# Altium footprint library AMLB_v1.PcbLib: 147 footprints (part 5 of 10)
Each footprint in its own frame and in the unit in brackets; x right, y up, seen from the top. Pads: shape width x height; smd on the part's side, far side on the other; paste and mask are expansions set on the pad; w line width, h text height; cw(c..) or ccw(c..) is an arc to the next point about the centre after c.
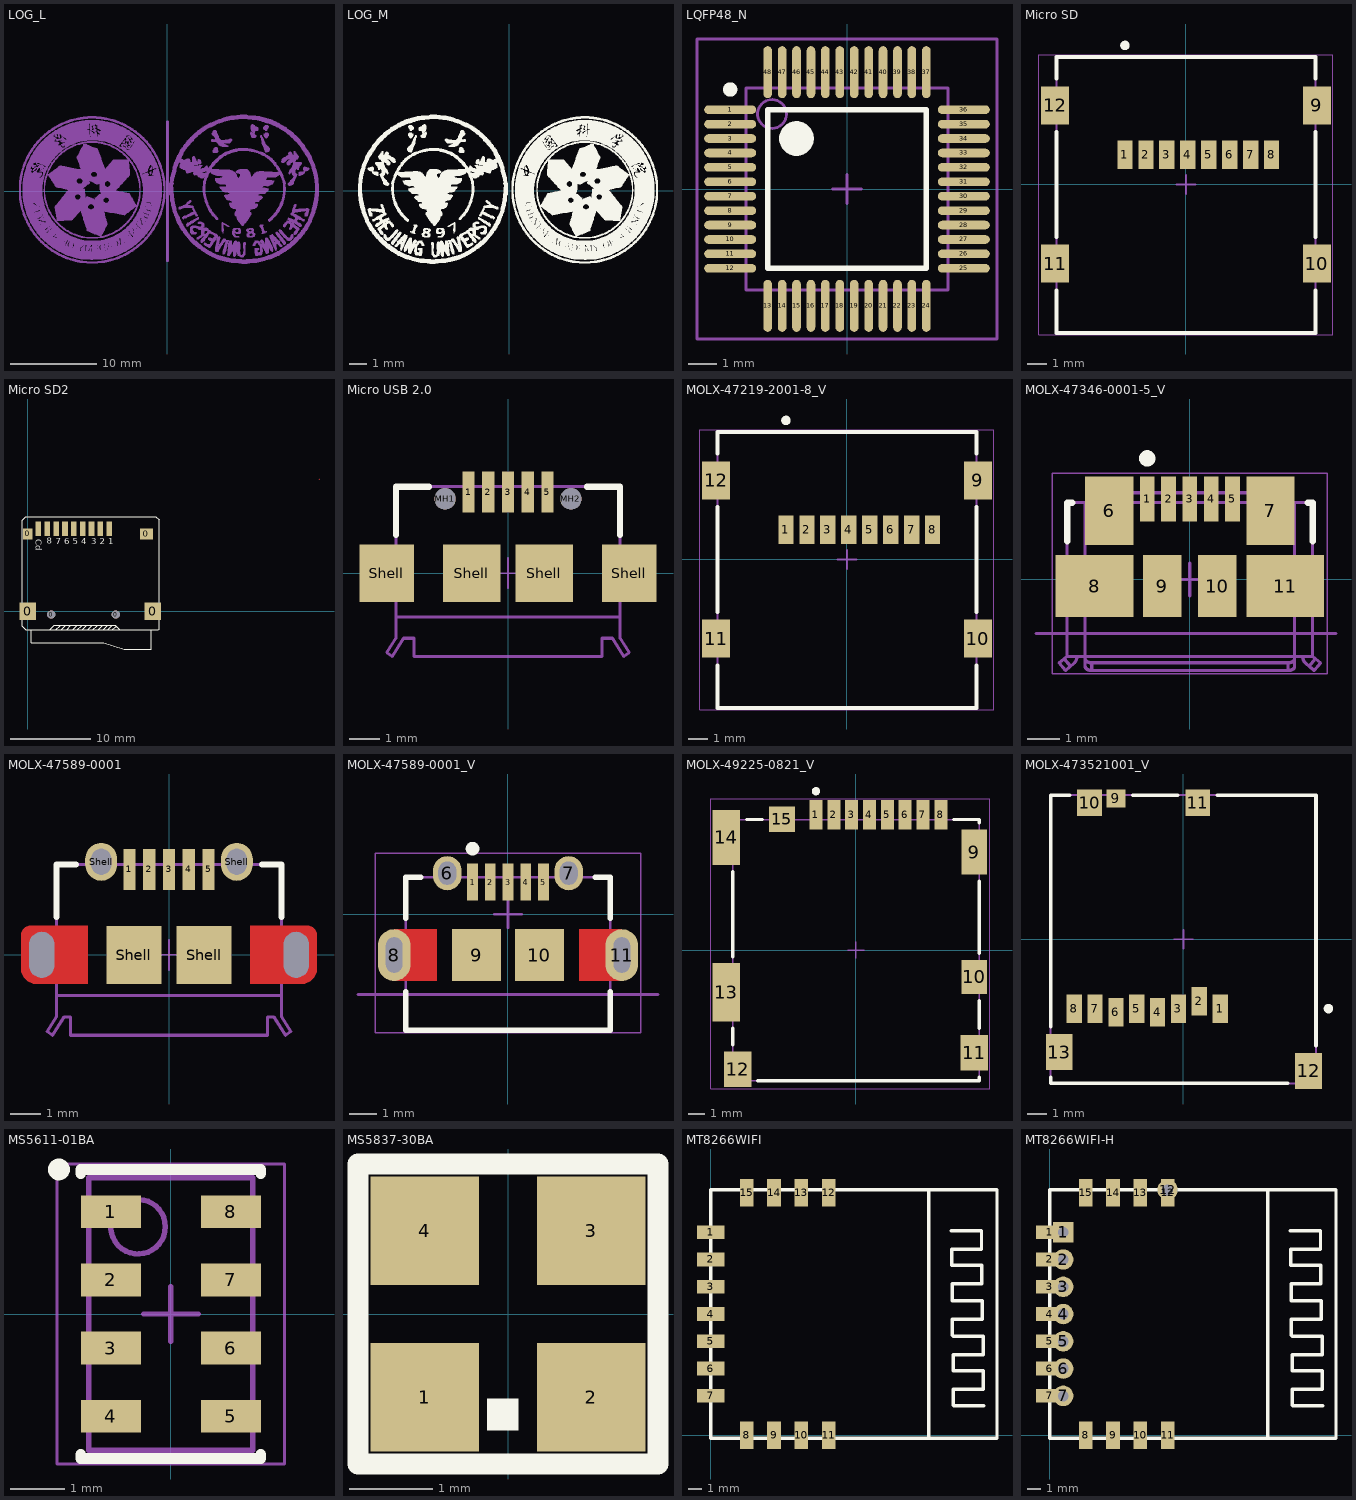
[diagram p4: the footprints below, top view; thin cyan lines are the x and y axes]

## LOG_L [mm]
Bottom Overlay:
  drawing of 5493 lines, arcs and shapes, not listed

## LOG_M [mm]
Top Overlay:
  drawing of 5491 lines, arcs and shapes, not listed

## LQFP48_N [mm]
height 0.559
pads (48):
  oval 1.8x0.3 smd: 1(-4.05,2.75) 2(-4.05,2.25) 3(-4.05,1.75) 4(-4.05,1.25) 5(-4.05,0.75) 6(-4.05,0.25) 7(-4.05,-0.25) 8(-4.05,-0.75) 9(-4.05,-1.25) 10(-4.05,-1.75) 11(-4.05,-2.25) 12(-4.05,-2.75) 25(4.05,-2.75) 26(4.05,-2.25) 27(4.05,-1.75) 28(4.05,-1.25) 29(4.05,-0.75) 30(4.05,-0.25) 31(4.05,0.25) 32(4.05,0.75) 33(4.05,1.25) 34(4.05,1.75) 35(4.05,2.25) 36(4.05,2.75)
  oval 0.3x1.8 smd: 13(-2.75,-4.05) 14(-2.25,-4.05) 15(-1.75,-4.05) 16(-1.25,-4.05) 17(-0.75,-4.05) 18(-0.25,-4.05) 19(0.25,-4.05) 20(0.75,-4.05) 21(1.25,-4.05) 22(1.75,-4.05) 23(2.25,-4.05) 24(2.75,-4.05) 37(2.75,4.05) 38(2.25,4.05) 39(1.75,4.05) 40(1.25,4.05) 41(0.75,4.05) 42(0.25,4.05) 43(-0.25,4.05) 44(-0.75,4.05) 45(-1.25,4.05) 46(-1.75,4.05) 47(-2.25,4.05) 48(-2.75,4.05)
Top Overlay:
  circle w0.6: c-1.75,1.75 r0.3
  circle w0.25: c-4.05,3.45 r0.125
  lines w0.2: -2.75,-2.75 2.75,-2.75 2.75,2.75 -2.75,2.75 -2.75,-2.75
Mechanical 13:
  circle w0.1: c-2.6,2.6 r0.5
  lines w0.1: -3.5,-3.5 3.5,-3.5 3.5,3.5 -3.5,3.5 -3.5,-3.5
Mechanical 15:
  lines w0.1: -0.5,0 0.5,0 ; 0,-0.5 0,0.5 ; -5.2,-5.2 5.2,-5.2 5.2,5.2 -5.2,5.2 -5.2,-5.2

## Micro SD [mm] "CONN, 8-Leads, Body 14.5x13.6mm, Pitch 1.1mm"
height 1.9
pads (12):
  rect 0.8x1.5 smd: 1(-3.205,1.55) 2(-2.105,1.55) 3(-1.005,1.55) 4(0.095,1.55) 5(1.195,1.55) 6(2.295,1.55) 7(3.395,1.55) 8(4.495,1.55)
  rect 1.45x2 smd: 9(6.875,4.15) 10(6.875,-4.15) 11(-6.875,-4.15) 12(-6.875,4.15)
Top Overlay:
  circle w0.25: c-3.205,7.3 r0.125
  lines w0.2: -6.8,-5.55 -6.8,-7.8 6.8,-7.8 6.8,-5.55 ; -6.8,-2.75 -6.8,2.75 ; -6.8,5.55 -6.8,6.7 6.8,6.7 6.8,5.55 ; 6.8,-2.75 6.8,2.75
Mechanical 13:
  lines w0.1: -6.8,-7.8 -6.8,6.7 6.8,6.7 6.8,-7.8 -6.8,-7.8
Mechanical 15:
  lines w0.05: -7.725,-7.9 -7.725,6.8 7.7,6.8 7.7,-7.9 -7.725,-7.9
  lines w0.1: -0.5,0 0.5,0 ; 0,-0.5 0,0.5
3D body "472192001.stp": height 1.91, standoff 0.02, extent -7.3,-7.793 7.3,6.707

## Micro SD2 [mm]
pads (15):
  rect 2.032x2.2 smd: 0(0,0) 0(15.5,0)
  rect 1.2x1.4 smd: 0(0,9.6)
  round 1 hole 1 unplated: 0(2.9,-0.4) 0(10.9,-0.4)
  rect 1.6x1.4 smd: 0(14.7,9.6)
  rect 0.7x1.8 smd: 1(10.1,10.227) 2(9,10.227) 3(7.9,10.227) 4(6.8,10.227) 5(5.7,10.227) 6(4.6,10.227) 7(3.5,10.227) 8(2.4,10.227) 9(1.3,10.227)
Top Layer:
  lines w0.03: 36.064,16.423 36.114,16.373
Top Overlay:
  lines w0.152: 0.423,-2.295 0.423,-3.87 9.414,-3.87 ; 3.471,-2.295 4.004,-1.762 4.004,-1.736 ; 4.131,-2.295 4.639,-1.787 4.639,-1.736 ; 4.868,-2.295 4.868,-2.219 5.35,-1.736 ; 5.553,-2.295 6.112,-1.736 6.138,-1.736 ; 6.138,-2.295 6.671,-1.762 6.671,-1.736 ; 6.773,-2.295 7.331,-1.736 7.433,-1.736 ; 7.433,-2.295 7.992,-1.736 8.017,-1.736 ; 8.068,-2.295 8.601,-1.762 8.601,-1.736 ; 8.703,-2.295 9.262,-1.736 9.389,-1.736 ; 9.338,-2.295 9.897,-1.736 9.922,-1.736 ; 9.389,-3.87 11.954,-4.683 15.307,-4.683 15.307,-2.321 ; 9.922,-2.295 10.481,-1.736 ; 10.481,-2.295 10.887,-1.889 10.964,-1.889 ; -0.289,-2.295 -0.72,-1.863 -0.72,11.319 -0.289,11.751 15.891,11.751 16.272,11.37 16.272,-2.194 16.171,-2.295 ; -0.289,-2.295 16.171,-2.295 ; -0.289,-2.295 2.709,-2.295 3.267,-1.736 10.811,-1.736 11.37,-2.295 16.171,-2.295
  text "Cd" at 0.981,8.932 h0.76
  text "8" at 2.328,8.373 h0.76
  text "7" at 3.445,8.347 h0.76
  text "6" at 4.512,8.347 h0.76
  text "5" at 5.579,8.347 h0.76
  text "4" at 6.646,8.322 h0.76
  text "3" at 7.839,8.322 h0.76
  text "2" at 8.906,8.322 h0.76
  text "1" at 9.998,8.297 h0.76
3D body "sdcard.STEP": height 1.8, standoff -0.7, extent -0.272,-4.625 16.001,10.569

## Micro USB 2.0 [mm] "629105136821,Micro USB 2.0 SMT Type B Horizontal 5 Contacts"
height 3
pads (11):
  rect 0.4x1.35 smd: 1(-1.3,2.675) 2(-0.65,2.675) 3(0,2.675) 4(0.65,2.675) 5(1.3,2.675)
  round 0.7 hole 0.7 unplated: MH1(-2.075,2.45) MH2(2.075,2.45)
  rect 1.8x1.9 smd: Shell(-4,0) Shell(4,0)
  rect 1.9x1.9 smd: Shell(-1.2,0) Shell(1.2,0)
Top Overlay:
  lines w0.2: -3.7,1.25 -3.7,2.85 -2.6,2.85 ; 2.6,2.85 3.7,2.85 3.7,1.25
Mechanical 2:
  lines w0.1: -3.7,-1.45 3.7,-1.45
  text "PCB Edge" at -1.2,-2.1 h0.41
Mechanical 13:
  lines w0.1: -1.425,2.85 -1.425,3.15 -1.175,3.15 -1.175,2.85 ; -0.775,2.85 -0.775,3.15 -0.525,3.15 -0.525,2.85 ; -0.125,2.85 -0.125,3.15 0.125,3.15 0.125,2.85 ; 0.525,2.85 0.525,3.15 0.775,3.15 0.775,2.85 ; 1.175,2.85 1.175,3.15 1.425,3.15 1.425,2.85 ; -4,-2.625 -3.7,-2.15 -3.7,2.85 3.7,2.85 3.7,-2.15 4,-2.625 3.825,-2.75 3.45,-2.15 3.1,-2.15 3.1,-2.75 -3.1,-2.75 -3.1,-2.15 -3.45,-2.15 -3.825,-2.75 -4,-2.625
Mechanical 15:
  lines w0.05: -0.5,0 0.5,0 ; 0,-0.5 0,0.5
3D body "629105136821.stp": height 2.69, standoff -0.61, extent -4,-2.73 4,3.173

## MOLX-47219-2001-8_V [mm] "CONN, 8-Leads, Body 14.5x13.6mm, Pitch 1.1mm"
height 1.9
pads (12):
  rect 0.8x1.5 smd: 1(-3.205,1.55) 2(-2.105,1.55) 3(-1.005,1.55) 4(0.095,1.55) 5(1.195,1.55) 6(2.295,1.55) 7(3.395,1.55) 8(4.495,1.55)
  rect 1.45x2 smd: 9(6.875,4.15) 10(6.875,-4.15) 11(-6.875,-4.15) 12(-6.875,4.15)
Top Overlay:
  circle w0.25: c-3.205,7.3 r0.125
  lines w0.2: -6.8,-5.55 -6.8,-7.8 6.8,-7.8 6.8,-5.55 ; -6.8,-2.75 -6.8,2.75 ; -6.8,5.55 -6.8,6.7 6.8,6.7 6.8,5.55 ; 6.8,-2.75 6.8,2.75
Mechanical 13:
  lines w0.1: -6.8,-7.8 6.8,-7.8 6.8,6.7 -6.8,6.7 -6.8,-7.8
Mechanical 15:
  lines w0.05: -7.725,-7.9 7.7,-7.9 7.7,6.8 -7.725,6.8 -7.725,-7.9
  lines w0.1: -0.5,0 0.5,0 ; 0,-0.5 0,0.5
3D body "472192001.stp": height 1.91, standoff 0.02, extent -7.3,-7.793 7.3,6.707

## MOLX-47346-0001-5_V [mm] "SMD, 5-Leads, Body 7.5x5mm, Pitch 0.65mm"
height 2.94
pads (11):
  rect 0.45x1.38 smd: 1(-1.3,2.46) 2(-0.65,2.46) 3(0,2.46) 4(0.65,2.46) 5(1.3,2.46)
  rect 1.475x2.1 smd: 6(-2.462,2.1) 7(2.462,2.1)
  rect 2.375x1.9 smd: 8(-2.913,-0.2) 11(2.913,-0.2)
  rect 1.175x1.9 smd: 9(-0.837,-0.2) 10(0.837,-0.2)
Top Overlay:
  circle w0.25: c-1.3,3.7 r0.125
  lines w0.2: -3.75,1.165 -3.75,2.35 -3.6,2.35 ; 3.6,2.35 3.75,2.35 3.75,1.165
Mechanical 6:
  lines w0.1: -4.7,-1.65 4.465,-1.65
  text "PCB EDGE" at -7.2,-1.757 h0.3
Mechanical 13:
  drawing of 439 lines, arcs and shapes, not listed
Mechanical 15:
  lines w0.05: -4.2,-2.88 4.2,-2.88 4.2,3.25 -4.2,3.25 -4.2,-2.88
  lines w0.1: -0.5,0 0.5,0 ; 0,-0.5 0,0.5
3D body "473460001.stp": height 2.69, standoff -0.25, extent -3.99,-2.78 3.99,2.65

## MOLX-47589-0001 [mm] "Micro USB 2.0 Type AB ，USB SMD, 5-Leads, Body 7.5x5.6mm, Pitch 0.65mm"
height 3
pads (11):
  rect 0.4x1.35 smd: 1(-1.3,2.805) 2(-0.65,2.805) 3(0,2.805) 4(0.65,2.805) 5(1.3,2.805)
  round 0 / inner oval 1.4x2.1 / far side oval 1.4x2.1 hole 0.825 slot 1.5 at 90 deg: Shell(-4.175,0)
  oval 1.05x1.25 hole 0.65 slot 0.85 at 90 deg: Shell(-2.225,3.055) Shell(2.225,3.055)
  rect 1.8x1.9 smd: Shell(-1.15,0) Shell(1.15,0)
  round 0 / inner round 0 / far side oval 1.4x2.1 hole 0.825 slot 1.5 at 90 deg: Shell(4.175,0)
Top Layer:
  region: 4.353,-0.95 4.452,-0.95 4.636,-0.874 4.776,-0.733 4.852,-0.549 4.852,-0.45 4.852,0.65 4.852,0.71 4.807,0.82 4.722,0.904 4.612,0.95 4.553,0.95 2.668,0.95 2.668,-0.95
  region: -4.353,-0.95 -4.452,-0.95 -4.636,-0.874 -4.776,-0.733 -4.852,-0.549 -4.852,-0.45 -4.852,0.65 -4.852,0.71 -4.807,0.82 -4.722,0.904 -4.612,0.95 -4.553,0.95 -2.668,0.95 -2.668,-0.95
Top Overlay:
  lines w0.2: -3.7,1.25 -3.7,2.97 -3.05,2.97 ; 3.05,2.97 3.7,2.97 3.7,1.25
Mechanical 2:
  lines w0.1: -3.7,-1.33 3.7,-1.33
  text "PCB Edge" at -1.1,-2 h0.41
Mechanical 13:
  lines w0.1: -4,-2.515 -3.7,-2.04 -3.7,2.97 3.7,2.97 3.7,-2.04 4,-2.515 3.825,-2.64 3.45,-2.04 3.24,-2.04 3.24,-2.64 -3.24,-2.64 -3.24,-2.04 -3.45,-2.04 -3.825,-2.64 -4,-2.515
Mechanical 15:
  lines w0.05: -0.5,0 0.5,0 ; 0,-0.5 0,0.5
3D body "629105150921.stp": height 2.76, standoff -0.52, extent -4.3,-2.64 4.3,3.23

## MOLX-47589-0001_V [mm] "USB SMD, 5-Leads, Body 7.5x5.6mm, Pitch 0.65mm"
height 2.65
pads (11):
  rect 0.4x1.35 smd: 1(-1.3,1.175) 2(-0.65,1.175) 3(0,1.175) 4(0.65,1.175) 5(1.3,1.175)
  oval 1.05x1.25 hole 0.65 slot 0.85 at 90 deg: 6(-2.225,1.5) 7(2.225,1.5)
  oval 1.2x1.9 hole 0.6 slot 1.3 at 90 deg: 8(-4.175,-1.5) 11(4.175,-1.5)
  rect 1.8x1.9 smd: 9(-1.15,-1.5) 10(1.15,-1.5)
Top Layer:
  rectangle: 2.6,-2.45 4.175,-0.55
  region: -2.6,-0.55 -4.175,-0.55 -4.175,-2.45 -2.6,-2.45
Top Overlay:
  circle w0.25: c-1.3,2.4 r0.125
  lines w0.2: -3.75,-2.85 -3.75,-4.25 3.75,-4.25 3.75,-2.85 ; -3.75,-0.15 -3.75,1.35 -3.2,1.35 ; 3.2,1.35 3.75,1.35 3.75,-0.15
Mechanical 1:
  lines w0.1: -5.5,-2.95 5.5,-2.95
  text "PCB EDGE" at 5.7,-2.5 h1
Mechanical 13:
  lines w0.1: -3.75,-4.25 3.75,-4.25 3.75,1.35 -3.75,1.35 -3.75,-4.25
Mechanical 15:
  lines w0.05: -4.875,-4.35 -4.875,2.225 4.875,2.225 4.875,-4.35 -4.875,-4.35
  lines w0.1: -0.5,0 0.5,0 ; 0,-0.5 0,0.5
3D body "475890001.stp": height 2.74, standoff -0.57, extent -4.325,-4.25 4.325,1.644

## MOLX-49225-0821_V [mm] "SMD, 15-Leads, Body 16.1x15.2mm"
height 1.95
pads (15):
  rect 0.8x1.8 smd: 1(-2.465,8.35) 2(-1.365,8.35) 3(-0.265,8.35) 4(0.835,8.35) 5(1.935,8.35) 6(3.035,8.35) 7(4.135,8.35) 8(5.235,8.35)
  rect 1.55x2.8 smd: 9(7.3,6.05)
  rect 1.55x2.1 smd: 10(7.3,-1.65)
  rect 1.7x2.2 smd: 11(7.3,-6.325) 12(-7.3,-7.35)
  rect 1.7x3.6 smd: 13(-8,-2.6)
  rect 1.7x3.4 smd: 14(-8,6.95)
  rect 1.6x1.55 smd: 15(-4.565,8.075)
Top Overlay:
  circle w0.25: c-2.465,9.8 r0.125
  lines w0.2: -7.6,-5.85 -7.6,-4.8 ; -7.6,-0.4 -7.6,4.85 ; -6.75,8.05 -5.765,8.05 ; -6.05,-8.05 7.6,-8.05 7.6,-7.825 ; 6.035,8.05 7.6,8.05 7.6,7.85 ; 7.6,-4.825 7.6,-3.1 ; 7.6,-0.2 7.6,4.25
Mechanical 13:
  lines w0.1: -7.6,-8.05 7.6,-8.05 7.6,8.05 -7.6,8.05 -7.6,-8.05
Mechanical 15:
  lines w0.05: -8.95,-8.55 8.25,-8.55 8.25,9.35 -8.95,9.35 -8.95,-8.55
  lines w0.1: -0.5,0 0.5,0 ; 0,-0.5 0,0.5
3D body "492250821.stp": height 1.98, standoff 0, extent -8.353,-8.144 7.747,8.906

## MOLX-473521001_V [mm] "SMD, 8-Leads, Body 15.2x14mm, Pitch 1.1mm"
height 1.88
pads (13):
  rect 0.8x1.5 smd: 1(1.94,-3.66) 2(0.84,-3.26) 3(-0.26,-3.66) 4(-1.36,-3.86) 5(-2.46,-3.66) 6(-3.56,-3.86) 7(-4.66,-3.66) 8(-5.76,-3.66)
  rect 1x0.95 smd: 9(-3.56,7.425)
  rect 1.3x1.4 smd: 10(-4.95,7.2) 11(0.75,7.2)
  rect 1.4x1.9 smd: 12(6.6,-6.95) 13(-6.55,-5.95)
Top Overlay:
  circle w0.25: c7.65,-3.66 r0.125
  lines w0.2: -7,-7.3 -7,-7.6 5.5,-7.6 ; -7,-4.6 -7,7.6 -6,7.6 ; -2.66,7.6 -0.3,7.6 ; 1.8,7.6 7,7.6 7,-5.6
Mechanical 13:
  lines w0.1: -7,-7.6 7,-7.6 7,7.6 -7,7.6 -7,-7.6
Mechanical 15:
  lines w0.1: -0.5,0 0.5,0 ; 0,-0.5 0,0.5
3D body "473521001.stp": height 1.85, standoff -0.03, extent -7.05,-7.6 7.05,7.6

## MS5611-01BA [mm] "SON, 8-Leads, Body 5.00x3.00mm, Pitch 1.25mm, IPC Medium Density"
height 1.8
pads (8):
  rect 1.1x0.6 smd: 1(-1.1,1.875) 2(-1.1,0.625) 3(-1.1,-0.625) 4(-1.1,-1.875) 5(1.1,-1.875) 6(1.1,-0.625) 7(1.1,0.625) 8(1.1,1.875)
Top Overlay:
  circle w0.2: c-2.05,2.65 r0.1
  lines w0.2: -1.65,-2.575 -1.65,-2.65 1.65,-2.65 1.65,-2.575 ; -1.65,2.575 -1.65,2.65 1.65,2.65 1.65,2.575
Mechanical 13:
  circle w0.1: c-0.6,1.6 r0.5
  lines w0.1: -1.5,-2.5 -1.5,2.5 1.5,2.5 1.5,-2.5 -1.5,-2.5
Mechanical 15:
  lines w0.05: -2.085,-2.75 -2.085,2.75 2.085,2.75 2.085,-2.75 -2.085,-2.75
  lines w0.1: -0.5,0 0.5,0 ; 0,-0.5 0,0.5
3D body: height 1.8, standoff 0.5, extent -1.5,-2.5 1.5,2.5

## MS5837-30BA [mm] "MS5837-30BA"
height 2.5
pads (4):
  rect 1.3x1.3 smd: 1(-1,-1) 2(1,-1) 3(1,1) 4(-1,1)
Top Overlay:
  rectangle: -0.254,-1.397 0.127,-1.016
  lines w0.254: -1.8,-1.8 1.8,-1.8 1.8,1.8 -1.8,1.8 -1.8,-1.8

## MT8266WIFI [mm] "Anylink-ESP8266"
pads (15):
  rect 2x1 smd: 1(0,14.9) 2(0,12.9) 3(0,10.9) 4(0,8.9) 5(0,6.9) 6(0,4.9) 7(0,2.9)
  rect 1x2 smd: 8(2.65,0) 9(4.65,0) 10(6.65,0) 11(8.65,0) 12(8.65,17.8) 13(6.65,17.8) 14(4.65,17.8) 15(2.65,17.8)
Top Overlay:
  lines w0.254: 17.653,15.011 19.863,15.011 19.863,13.665 17.678,13.665 17.678,12.497 17.704,12.471 ; 17.678,12.471 19.888,12.471 19.888,11.125 17.704,11.125 17.704,9.957 17.729,9.931 ; 17.704,9.855 19.914,9.855 19.914,8.509 17.729,8.509 17.729,7.341 17.755,7.315 ; 17.78,4.724 19.99,4.724 19.99,3.378 17.805,3.378 17.805,2.21 17.831,2.184 20.015,2.184 ; 17.78,7.264 19.99,7.264 19.99,5.918 17.805,5.918 17.805,4.75 17.831,4.724 ; 16,-0.2 0,-0.2 0,18 16,18 ; 16,-0.2 16,18 ; 16,-0.2 21,-0.2 21,18 16,18

## MT8266WIFI-H [mm] "Anylink-ESP8266"
pads (23):
  rect 2x1 smd: 1(0,14.9) 2(0,12.9) 3(0,10.9) 4(0,8.9) 5(0,6.9) 6(0,4.9) 7(0,2.9)
  rect 1.5x1.5 hole 0.8: 1(1,14.896)
  round 1.5 hole 0.8: 2(1,12.896) 3(1,10.896) 4(1,8.896) 5(1,6.896) 6(1,4.896) 7(1,2.896) 12(8.65,18)
  rect 1x2 smd: 8(2.65,0) 9(4.65,0) 10(6.65,0) 11(8.65,0) 12(8.65,17.8) 13(6.65,17.8) 14(4.65,17.8) 15(2.65,17.8)
Top Overlay:
  lines w0.254: 17.653,15.011 19.863,15.011 19.863,13.665 17.678,13.665 17.678,12.497 17.704,12.471 ; 17.678,12.471 19.888,12.471 19.888,11.125 17.704,11.125 17.704,9.957 17.729,9.931 ; 17.704,9.855 19.914,9.855 19.914,8.509 17.729,8.509 17.729,7.341 17.755,7.315 ; 17.78,4.724 19.99,4.724 19.99,3.378 17.805,3.378 17.805,2.21 17.831,2.184 20.015,2.184 ; 17.78,7.264 19.99,7.264 19.99,5.918 17.805,5.918 17.805,4.75 17.831,4.724 ; 16,-0.2 21,-0.2 21,18 16,18 ; 16,-0.2 16,18 ; 16,-0.2 0,-0.2 0,18 16,18